# Altium footprint library PCB_Display_Doru.PcbLib: 47 footprints (part 1 of 3)
Each footprint in its own frame and in the unit in brackets; x right, y up, seen from the top. Pads: shape width x height; smd on the part's side, far side on the other; paste and mask are expansions set on the pad; w line width, h text height; cw(c..) or ccw(c..) is an arc to the next point about the centre after c.
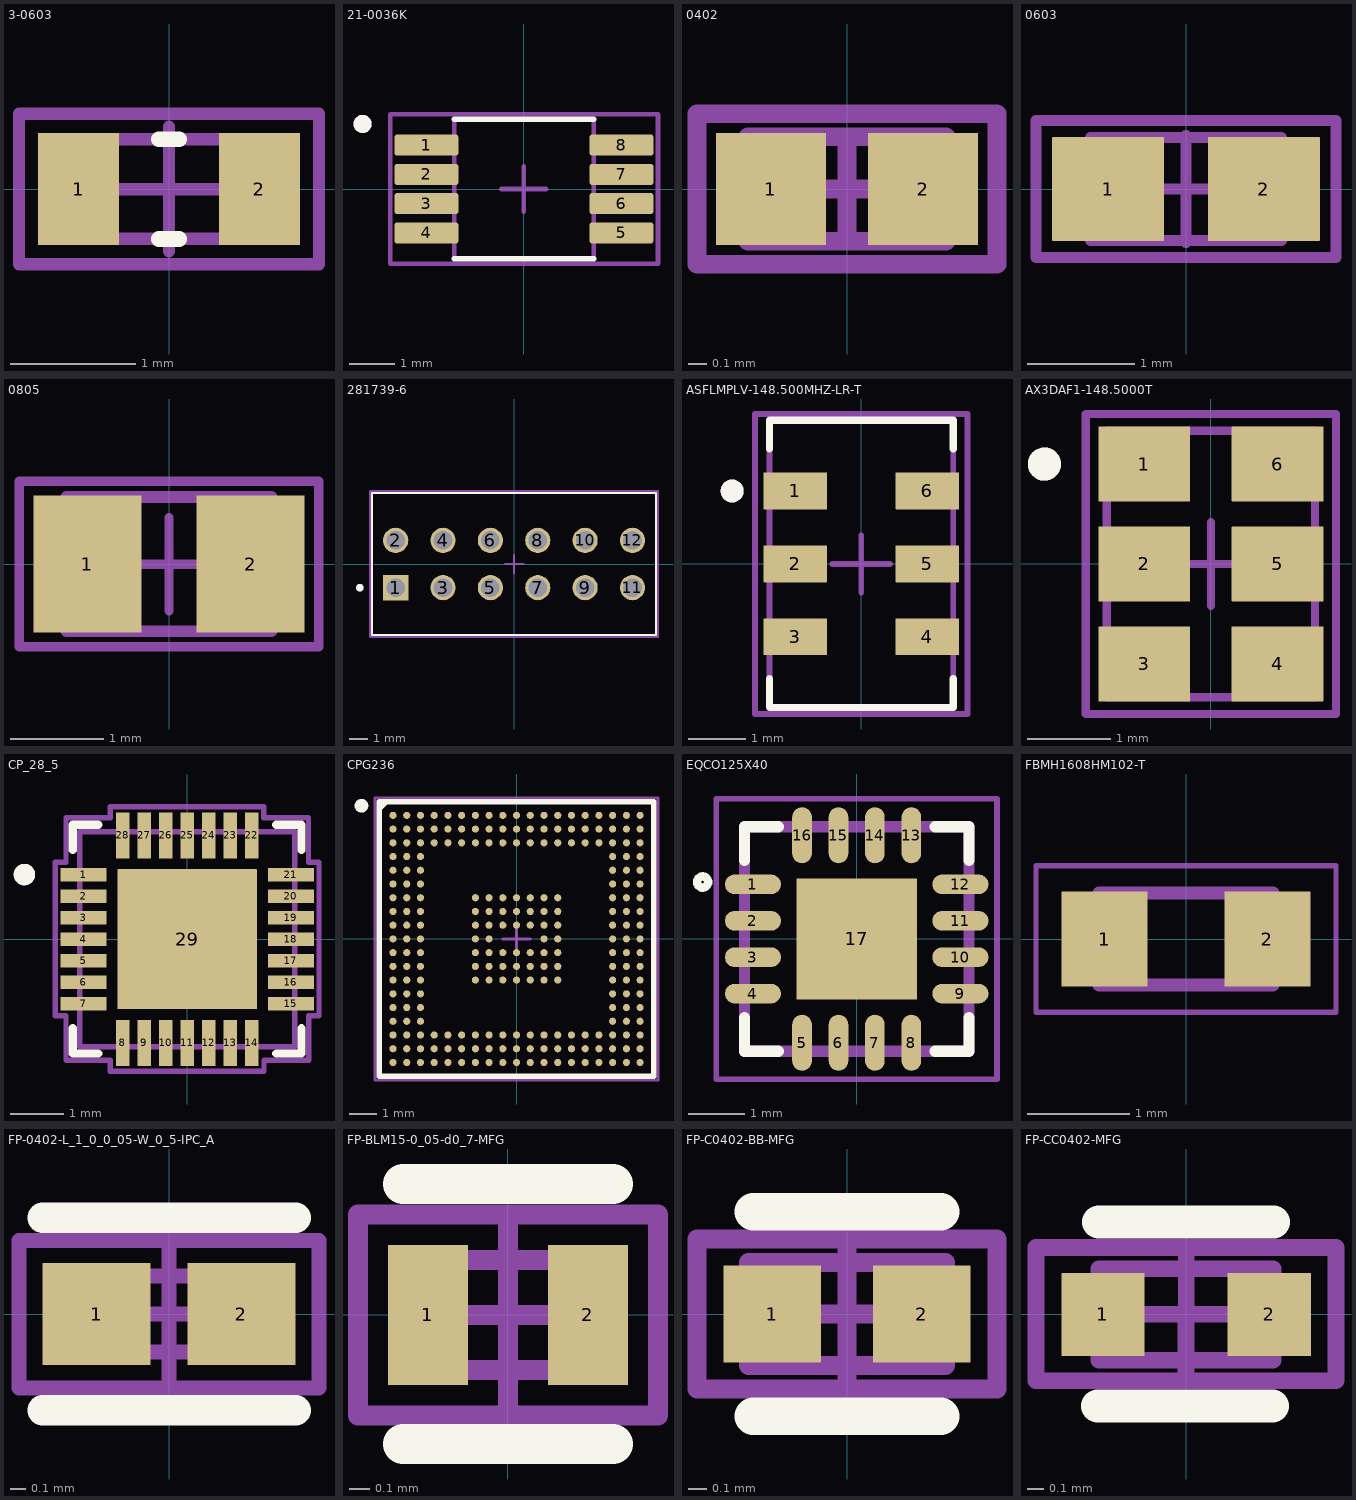
[diagram p0: the footprints below, top view; thin cyan lines are the x and y axes]

## 3-0603 [mm] "Chip Resistor; Body 1.6 x 0.9 mm (LxW typ)"
height 0.55
pads (2):
  rrect1% 0.65x0.9 smd: 1(-0.725,0) 2(0.725,0)
Top Overlay:
  lines w0.127: -0.08,-0.4 0.08,-0.4 ; -0.08,0.4 0.08,0.4
Top Assembly (Mech13):
  lines w0.1: -0.8,-0.4 0.8,-0.4 0.8,0.4 -0.8,0.4 -0.8,-0.4
  text ".Designator" at -0.676,-0.068 h0.3
Top Component Outline (Mech15):
  lines w0.1: -0.5,0 0.5,0 ; 0,-0.5 0,0.5 ; -1.203,-0.604 1.203,-0.604 1.203,0.606 -1.203,0.606 -1.203,-0.604
3D body "ERJ3EKF1000V.STEP": height 0.45, standoff 0, extent -0.8,-0.4 0.8,0.4

## 21-0036K [mm]
pads (8):
  rrect25% 1.42x0.47 smd mask+0.05: 1(-2.165,0.975) 2(-2.165,0.325) 3(-2.165,-0.325) 4(-2.165,-0.975) 5(2.165,-0.975) 6(2.165,-0.325) 7(2.165,0.325) 8(2.165,0.975)
Top Overlay:
  circle w0.2: c-3.585,1.445 r0.1
  lines w0.127: -1.55,-1.55 1.55,-1.55 ; -1.55,1.55 1.55,1.55
Top Assembly (Mech13):
  circle w0.2: c-3.585,1.445 r0.1
  lines w0.1: -1.55,-1.55 1.55,-1.55 1.55,1.55 -1.55,1.55 -1.55,-1.55
  text ".Designator" at -0.676,-0.068 h0.3
Top Component Outline (Mech15):
  lines w0.1: -0.5,0 0.5,0 ; 0,-0.5 0,0.5 ; -2.974,-1.661 2.976,-1.661 2.976,1.663 -2.974,1.663 -2.974,-1.661
3D body "step_temp.STEP": height 1.1, standoff 0, extent -2.452,-1.5 2.452,1.5

## 0402 [mm] "Chip Capacitor; Body 1.0 x 0.5 mm (LxW typ)"
height 0.55
pads (2):
  rrect1% 0.59x0.6 smd mask+0.05: 1(-0.407,0) 2(0.407,0)
Top Assembly (Mech13):
  lines w0.1: -0.53,-0.28 0.53,-0.28 0.53,0.28 -0.53,0.28 -0.53,-0.28
  text ".Designator" at -0.676,-0.068 h0.3
Top Component Outline (Mech15):
  lines w0.1: -0.28,0 0.28,0 ; 0,-0.28 0,0.28 ; -0.803,-0.402 -0.803,0.403 0.803,0.403 0.803,-0.402 -0.803,-0.402
3D body "C0402C104K4RAC.STEP": height 0.5, standoff 0, extent -0.5,-0.28 0.5,0.27

## 0603 [mm] "Chip Capacitor; Body 1.6 x 0.8 mm (LxW typ)"
height 0.87
pads (2):
  rrect1% 1.04x0.97 smd: 1(-0.726,0) 2(0.726,0)
Top Assembly (Mech13):
  lines w0.1: -0.89,-0.48 -0.89,0.48 0.89,0.48 0.89,-0.48 -0.89,-0.48
  text ".Designator" at -0.676,-0.068 h0.3
Top Component Outline (Mech15):
  lines w0.1: -0.5,0 0.5,0 ; 0,-0.5 0,0.5 ; -1.397,-0.637 -1.397,0.637 1.397,0.637 1.397,-0.637 -1.397,-0.637
3D body "C0603C103K5RAC (1).STEP": height 0.8, standoff 0, extent -0.8,-0.435 0.8,0.435

## 0805 [mm] "Chip Capacitor; Body 2.0 x 1.2 mm (LxW typ)"
height 1.3
pads (2):
  rrect1% 1.16x1.47 smd: 1(-0.875,0) 2(0.875,0)
Top Assembly (Mech13):
  lines w0.127: -1.1,-0.72 -1.1,0.72 1.1,0.72 1.1,-0.72 -1.1,-0.72
  text ".Designator" at -0.676,-0.068 h0.3
Top Component Outline (Mech15):
  lines w0.1: -0.5,0 0.5,0 ; 0,-0.5 0,0.5 ; -1.609,-0.886 1.608,-0.886 1.608,0.889 -1.609,0.889 -1.609,-0.886
3D body "C0805C103K1RAC.STEP": height 1.29, standoff 0.02, extent -1.016,-0.7 1.016,0.697

## 281739-6 [mm]
pads (12):
  rect 1.35x1.35 hole 1: 1(-6.35,-1.27)
  round 1.35 hole 1: 2(-6.35,1.27) 3(-3.81,-1.27) 4(-3.81,1.27) 5(-1.27,-1.27) 6(-1.27,1.27) 7(1.27,-1.27) 8(1.27,1.27) 9(3.81,-1.27) 10(3.81,1.27) 11(6.35,-1.27) 12(6.35,1.27)
Top Overlay:
  circle w0.2: c-8.27,-1.27 r0.1
  lines w0.1: -7.62,-3.81 7.62,-3.81 7.62,3.81 -7.62,3.81 -7.62,-3.81
Top Assembly (Mech13):
  circle w0.2: c-8.27,-1.27 r0.1
  lines w0.1: -7.62,-3.81 -7.62,3.81 ; -7.62,-3.81 7.62,-3.81 ; -7.62,-3.81 -7.62,3.81 ; -7.62,3.81 7.62,3.81 ; -7.62,3.81 7.62,3.81 ; 7.62,-3.81 7.62,3.81 ; 7.62,-3.81 7.62,3.81
  text ".Designator" at -0.676,-0.068 h0.3
Top Component Outline (Mech15):
  lines w0.1: -0.5,0 0.5,0 ; 0,-0.5 0,0.5 ; -7.72,-3.909 7.719,-3.909 7.719,3.91 -7.72,3.91 -7.72,-3.909
3D body "281739-6.stp": height 12, standoff -2.3, extent -7.62,-3.77 7.62,3.77

## ASFLMPLV-148.500MHZ-LR-T [mm]
pads (6):
  rrect1% 1.1x0.64 smd: 1(-1.15,1.27) 2(-1.15,0) 3(-1.15,-1.27) 4(1.15,-1.27) 5(1.15,0) 6(1.15,1.27)
Top Overlay:
  circle w0.2: c-2.25,1.27 r0.1
  lines w0.127: -1.6,-2 -1.6,-2.5 1.6,-2.5 1.6,-2 ; -1.6,2 -1.6,2.5 1.6,2.5 1.6,2
Top Assembly (Mech13):
  circle w0.2: c-2.25,1.27 r0.1
  lines w0.1: -1.6,-2.5 1.6,-2.5 1.6,2.5 -1.6,2.5 -1.6,-2.5
  text ".Designator" at -0.676,-0.068 h0.3
Top Component Outline (Mech15):
  lines w0.1: -0.5,0 0.5,0 ; 0,-0.5 0,0.5 ; -1.851,-2.615 1.852,-2.615 1.852,2.611 -1.851,2.611 -1.851,-2.615
3D body "ASFLMPLV-148.500MHZ-LR-T.STEP": height 0.86, standoff 0.01, extent -1.6,-2.5 1.6,2.5

## AX3DAF1-148.5000T [mm]
pads (6):
  rrect1% 1.1x0.9 smd: 1(-0.8,1.2) 2(-0.8,0) 3(-0.8,-1.2) 4(0.8,-1.2) 5(0.8,0) 6(0.8,1.2)
Top Overlay:
  circle w0.2: c-2,1.2 r0.1
Top Assembly (Mech13):
  circle w0.2: c-2,1.2 r0.1
  lines w0.1: -1.25,-1.6 -1.25,1.6 1.25,1.6 1.25,-1.6 -1.25,-1.6
  text ".Designator" at -0.676,-0.068 h0.3
Top Component Outline (Mech15):
  lines w0.1: -0.5,0 0.5,0 ; 0,-0.5 0,0.5 ; -1.502,-1.802 -1.502,1.801 1.501,1.801 1.501,-1.802 -1.502,-1.802
3D body "step_temp.STEP": height 1, standoff 0, extent -1.25,-1.6 1.25,1.6

## CP_28_5 [mm]
pads (29):
  rrect1% 0.855x0.25 smd mask+0.05: 1(-1.927,1.2) 2(-1.927,0.8) 3(-1.927,0.4) 4(-1.927,0) 5(-1.927,-0.4) 6(-1.927,-0.8) 7(-1.927,-1.2) 15(1.927,-1.2) 16(1.927,-0.8) 17(1.927,-0.4) 18(1.927,0) 19(1.927,0.4) 20(1.927,0.8) 21(1.927,1.2)
  rrect1% 0.25x0.855 smd mask+0.05: 8(-1.2,-1.927) 9(-0.8,-1.927) 10(-0.4,-1.927) 11(0,-1.927) 12(0.4,-1.927) 13(0.8,-1.927) 14(1.2,-1.927) 22(1.2,1.927) 23(0.8,1.927) 24(0.4,1.927) 25(0,1.927) 26(-0.4,1.927) 27(-0.8,1.927) 28(-1.2,1.927)
  rrect1% 2.6x2.6 smd paste-1.287 mask+0.05: 29(0,0)
Top Overlay:
  circle w0.2: c-3.027,1.2 r0.1
  lines w0.152: -2.127,-1.655 -2.127,-2.127 -1.655,-2.127 ; -2.127,1.655 -2.127,2.127 -1.655,2.127 ; 1.655,-2.127 2.127,-2.127 2.127,-1.655 ; 1.655,2.127 2.127,2.127 2.127,1.655
Top Paste:
  region: 1.2,-0.1 0.1,-0.1 0.1,-1.2 1.2,-1.2
  region: 1.2,1.2 0.1,1.2 0.1,0.1 1.2,0.1
  region: -0.1,-0.1 -1.2,-0.1 -1.2,-1.2 -0.1,-1.2
  region: -0.1,1.2 -1.2,1.2 -1.2,0.1 -0.1,0.1
Top Assembly (Mech13):
  lines w0.1: -2,-2 -2,2 2,2 2,-2 -2,-2
  text ".Designator" at -0.676,-0.068 h0.3
Top Component Outline (Mech15):
  lines w0.1: -0.5,0 0.5,0 ; 0,-0.5 0,0.5 ; -2.456,-1.426 -2.456,1.426 -2.254,1.426 -2.254,2.254 -1.428,2.254 -1.428,2.463 1.425,2.463 1.425,2.254 2.254,2.254 2.254,1.429 2.45,1.429 2.45,-1.424 2.26,-1.424 2.26,-2.254 1.427,-2.254 1.427,-2.457 -1.43,-2.457 -1.43,-2.254 -2.254,-2.254 -2.254,-1.426 -2.456,-1.426
3D body "CP_28_5.step": height 0.8, standoff 0, extent -2.05,-2.05 2.05,2.05

## CPG236 [mm] "BGA, 238-Ball, Body 10x10mm,Pitch 0.5mm"
height 1.38
pads (238):
  round 0.26 smd mask+0.02: A1(-4.5,4.5) A2(-4,4.5) A3(-3.5,4.5) A4(-3,4.5) A5(-2.5,4.5) A6(-2,4.5) A7(-1.5,4.5) A8(-1,4.5) A9(-0.5,4.5) A10(0,4.5) A11(0.5,4.5) A12(1,4.5) A13(1.5,4.5) A14(2,4.5) A15(2.5,4.5) A16(3,4.5) A17(3.5,4.5) A18(4,4.5) A19(4.5,4.5) B1(-4.5,4) B2(-4,4) B3(-3.5,4) B4(-3,4) B5(-2.5,4) B6(-2,4) B7(-1.5,4) B8(-1,4) B9(-0.5,4) B10(0,4) B11(0.5,4) B12(1,4) B13(1.5,4) B14(2,4) B15(2.5,4) B16(3,4) B17(3.5,4) B18(4,4) B19(4.5,4) C1(-4.5,3.5) C2(-4,3.5) C3(-3.5,3.5) C4(-3,3.5) C5(-2.5,3.5) C6(-2,3.5) C7(-1.5,3.5) C8(-1,3.5) C9(-0.5,3.5) C10(0,3.5) C11(0.5,3.5) C12(1,3.5) C13(1.5,3.5) C14(2,3.5) C15(2.5,3.5) C16(3,3.5) C17(3.5,3.5) C18(4,3.5) C19(4.5,3.5) D1(-4.5,3) D2(-4,3) D3(-3.5,3) D17(3.5,3) D18(4,3) D19(4.5,3) E1(-4.5,2.5) E2(-4,2.5) E3(-3.5,2.5) E17(3.5,2.5) E18(4,2.5) E19(4.5,2.5) F1(-4.5,2) F2(-4,2) F3(-3.5,2) F17(3.5,2) F18(4,2) F19(4.5,2) G1(-4.5,1.5) G2(-4,1.5) G3(-3.5,1.5) G7(-1.5,1.5) G8(-1,1.5) G9(-0.5,1.5) G10(0,1.5) G11(0.5,1.5) G12(1,1.5) G13(1.5,1.5) G17(3.5,1.5) G18(4,1.5) G19(4.5,1.5) H1(-4.5,1) H2(-4,1) H3(-3.5,1) H7(-1.5,1) H8(-1,1) H9(-0.5,1) H10(0,1) H11(0.5,1) H12(1,1) H13(1.5,1) H17(3.5,1) H18(4,1) H19(4.5,1) J1(-4.5,0.5) J2(-4,0.5) J3(-3.5,0.5) J7(-1.5,0.5) J8(-1,0.5) J9(-0.5,0.5) J10(0,0.5) J11(0.5,0.5) J12(1,0.5) J13(1.5,0.5) J17(3.5,0.5) J18(4,0.5) J19(4.5,0.5) K1(-4.5,0) K2(-4,0) K3(-3.5,0) K7(-1.5,0) K8(-1,0) K12(1,0) K13(1.5,0) K17(3.5,0) K18(4,0) K19(4.5,0) L1(-4.5,-0.5) L2(-4,-0.5) L3(-3.5,-0.5) L7(-1.5,-0.5) L8(-1,-0.5) L9(-0.5,-0.5) L10(0,-0.5) L11(0.5,-0.5) L12(1,-0.5) L13(1.5,-0.5) L17(3.5,-0.5) L18(4,-0.5) L19(4.5,-0.5) M1(-4.5,-1) M2(-4,-1) M3(-3.5,-1) M7(-1.5,-1) M8(-1,-1) M9(-0.5,-1) M10(0,-1) M11(0.5,-1) M12(1,-1) M13(1.5,-1) M17(3.5,-1) M18(4,-1) M19(4.5,-1) N1(-4.5,-1.5) N2(-4,-1.5) N3(-3.5,-1.5) N7(-1.5,-1.5) N8(-1,-1.5) N9(-0.5,-1.5) N10(0,-1.5) N11(0.5,-1.5) N12(1,-1.5) N13(1.5,-1.5) N17(3.5,-1.5) N18(4,-1.5) N19(4.5,-1.5) P1(-4.5,-2) P2(-4,-2) P3(-3.5,-2) P17(3.5,-2) P18(4,-2) P19(4.5,-2) R1(-4.5,-2.5) R2(-4,-2.5) R3(-3.5,-2.5) R17(3.5,-2.5) R18(4,-2.5) R19(4.5,-2.5) T1(-4.5,-3) T2(-4,-3) T3(-3.5,-3) T17(3.5,-3) T18(4,-3) T19(4.5,-3) U1(-4.5,-3.5) U2(-4,-3.5) U3(-3.5,-3.5) U4(-3,-3.5) U5(-2.5,-3.5) U6(-2,-3.5) U7(-1.5,-3.5) U8(-1,-3.5) U9(-0.5,-3.5) U10(0,-3.5) U11(0.5,-3.5) U12(1,-3.5) U13(1.5,-3.5) U14(2,-3.5) U15(2.5,-3.5) U16(3,-3.5) U17(3.5,-3.5) U18(4,-3.5) U19(4.5,-3.5) V1(-4.5,-4) V2(-4,-4) V3(-3.5,-4) V4(-3,-4) V5(-2.5,-4) V6(-2,-4) V7(-1.5,-4) V8(-1,-4) V9(-0.5,-4) V10(0,-4) V11(0.5,-4) V12(1,-4) V13(1.5,-4) V14(2,-4) V15(2.5,-4) V16(3,-4) V17(3.5,-4) V18(4,-4) V19(4.5,-4) W1(-4.5,-4.5) W2(-4,-4.5) W3(-3.5,-4.5) W4(-3,-4.5) W5(-2.5,-4.5) W6(-2,-4.5) W7(-1.5,-4.5) W8(-1,-4.5) W9(-0.5,-4.5) W10(0,-4.5) W11(0.5,-4.5) W12(1,-4.5) W13(1.5,-4.5) W14(2,-4.5) W15(2.5,-4.5) W16(3,-4.5) W17(3.5,-4.5) W18(4,-4.5) W19(4.5,-4.5)
Top Overlay:
  circle w0.25: c-5.65,4.85 r0.125
  region: -4.742,5 -5,4.742 -5,5
  lines w0.2: -5,4.742 -4.742,5 ; -5,-5 -5,5 5,5 5,-5 -5,-5
Top Assembly (Mech13):
  lines w0.1: -5,-5 -5,5 5,5 5,-5 -5,-5
  text ".Designator" at -0.676,-0.068 h0.3
Top Component Outline (Mech15):
  lines w0.1: -0.5,0 0.5,0 ; 0,-0.5 0,0.5 ; -5.155,-5.152 -5.155,5.146 5.152,5.146 5.152,-5.152 -5.155,-5.152
3D body: height 1.38, standoff 0.17, extent -5,-5 5,5

## EQCO125X40 [mm]
pads (17):
  oval 1x0.35 smd: 1(-1.85,0.975) 2(-1.85,0.325) 3(-1.85,-0.325) 4(-1.85,-0.975) 9(1.85,-0.975) 10(1.85,-0.325) 11(1.85,0.325) 12(1.85,0.975)
  oval 0.35x1 smd: 5(-0.975,-1.85) 6(-0.325,-1.85) 7(0.325,-1.85) 8(0.975,-1.85) 13(0.975,1.85) 14(0.325,1.85) 15(-0.325,1.85) 16(-0.975,1.85)
  rect 2.15x2.15 smd paste-2: 17(0,0)
Top Overlay:
  circle w0.15: c-2.748,1.016 r0.1
  lines w0.2: -2,-1.4 -2,-2 -1.4,-2 ; -2,1.4 -2,2 -1.4,2 ; 1.4,-2 2,-2 2,-1.4 ; 1.4,2 2,2 2,1.4
Top Paste:
  region: 0.775,-0.748 -0.754,-0.748 -0.754,0.781 0.775,0.781
Top Assembly (Mech13):
  lines w0.2: -2,-2 2,-2 2,2 -2,2 -2,-2
  text ".Designator" at -0.676,-0.068 h0.3
Top Component Outline (Mech15):
  lines w0.1: -2.502,-2.502 2.502,-2.502 2.502,2.502 -2.502,2.502 -2.502,-2.502 ; -0.5,0 0.5,0 -0.5,0 ; 0,-0.5 0,0.5 0,-0.5

## FBMH1608HM102-T [mm]
pads (2):
  rect 0.84x0.93 smd: 1(-0.795,0) 2(0.795,0)
Top Assembly (Mech13):
  lines w0.127: -0.85,-0.45 0.85,-0.45 0.85,0.45 -0.85,0.45 -0.85,-0.45
Top Component Outline (Mech15):
  lines w0.05: -1.465,-0.715 1.465,-0.715 1.465,0.715 -1.465,0.715 -1.465,-0.715
3D body "FBMH1608HM102-T.STEP": height 0.8, standoff 0, extent -0.8,-0.45 0.8,0.45

## FP-0402-L_1_0_0_05-W_0_5-IPC_A [mm]
height 8.35
pads (2):
  rrect1% 0.715x0.672 smd paste+0: 1(-0.479,0) 2(0.479,0)
Top Overlay:
  lines w0.2: -0.836,-0.636 0.836,-0.636 ; -0.836,0.636 0.836,0.636
Top Assembly (Mech13):
  lines w0.1: -0.5,-0.25 -0.5,0.25 0.5,0.25 0.5,-0.25 -0.5,-0.25
  text ".Designator" at -0.676,-0.068 h0.3
Top Component Outline (Mech15):
  lines w0.1: -0.5,0 0.5,0 ; 0,-0.5 0,0.5 ; -0.991,-0.49 0.991,-0.49 0.991,0.487 -0.991,0.487 -0.991,-0.49
3D body "Cap_Taiyo_Yuden_QVS105CG0R9BVHF_eec.STEP": height 0.55, standoff 0, extent -0.5,-0.25 0.5,0.25

## FP-BLM15-0_05-d0_7-MFG [mm]
height 8.35
pads (2):
  rrect1% 0.4x0.7 smd paste-1000: 1(-0.4,0) 2(0.4,0)
Top Overlay:
  lines w0.2: -0.525,-0.645 0.525,-0.645 ; -0.525,0.655 0.525,0.655
Top Paste:
  rectangle: 0.2,-0.25 0.6,0.25
  rectangle: -0.6,-0.25 -0.2,0.25
Top Solder:
  rectangle: 0.2,-0.25 0.6,0.25
  rectangle: -0.6,-0.25 -0.2,0.25
Top Assembly (Mech13):
  lines w0.1: -0.525,-0.275 0.525,-0.275 0.525,0.275 -0.525,0.275 -0.525,-0.275
  text ".Designator" at -0.676,-0.068 h0.3
Top Component Outline (Mech15):
  lines w0.1: -0.5,0 0.5,0 ; 0,-0.5 0,0.5 ; -0.75,-0.501 -0.75,0.503 0.75,0.503 0.75,-0.501 -0.75,-0.501
3D body "FBead_Murata_BLM15PD600SN1J_eec.STEP": height 0.55, standoff 0, extent -0.5,-0.25 0.5,0.25

## FP-C0402-BB-MFG [mm]
height 8.35
pads (2):
  rrect1% 0.52x0.52 smd paste+0: 1(-0.4,0) 2(0.4,0)
Top Overlay:
  lines w0.2: -0.5,-0.545 0.5,-0.545 ; -0.5,0.545 0.5,0.545
Top Assembly (Mech13):
  lines w0.1: -0.525,-0.275 0.525,-0.275 0.525,0.275 -0.525,0.275 -0.525,-0.275
  text ".Designator" at -0.676,-0.068 h0.3
Top Component Outline (Mech15):
  lines w0.1: -0.4,0 0.4,0 ; 0,-0.4 0,0.4 ; -0.8,-0.4 -0.8,0.4 0.8,0.4 0.8,-0.4 -0.8,-0.4
3D body "Cap_Kemet_C0402C562J5RACTU_eec.STEP": height 0.55, standoff 0, extent -0.5,-0.25 0.5,0.25

## FP-CC0402-MFG [mm]
height 8.35
pads (2):
  rrect1% 0.5x0.5 smd paste+0: 1(-0.5,0) 2(0.5,0)
Top Overlay:
  lines w0.2: -0.53,-0.551 0.52,-0.551 ; -0.525,0.555 0.525,0.555
Top Assembly (Mech13):
  lines w0.1: -0.525,-0.275 0.525,-0.275 0.525,0.275 -0.525,0.275 -0.525,-0.275
  text ".Designator" at -0.624,-0.065 h0.3
Top Component Outline (Mech15):
  lines w0.1: -0.401,0.001 0.401,0.001 ; 0,-0.4 0,0.402 ; -0.902,-0.4 0.901,-0.4 0.901,0.402 -0.902,0.402 -0.902,-0.4
3D body "Cap_YAGEO_CC0402KRX7R9BB101_eec.STEP": height 0.55, standoff 0, extent -0.5,-0.25 0.5,0.25